# Altium footprint library EXPLORER.PcbLib: 252 footprints (part 6 of 16)
Each footprint in its own frame and in the unit in brackets; x right, y up, seen from the top. Pads: shape width x height; smd on the part's side, far side on the other; paste and mask are expansions set on the pad; w line width, h text height; cw(c..) or ccw(c..) is an arc to the next point about the centre after c.
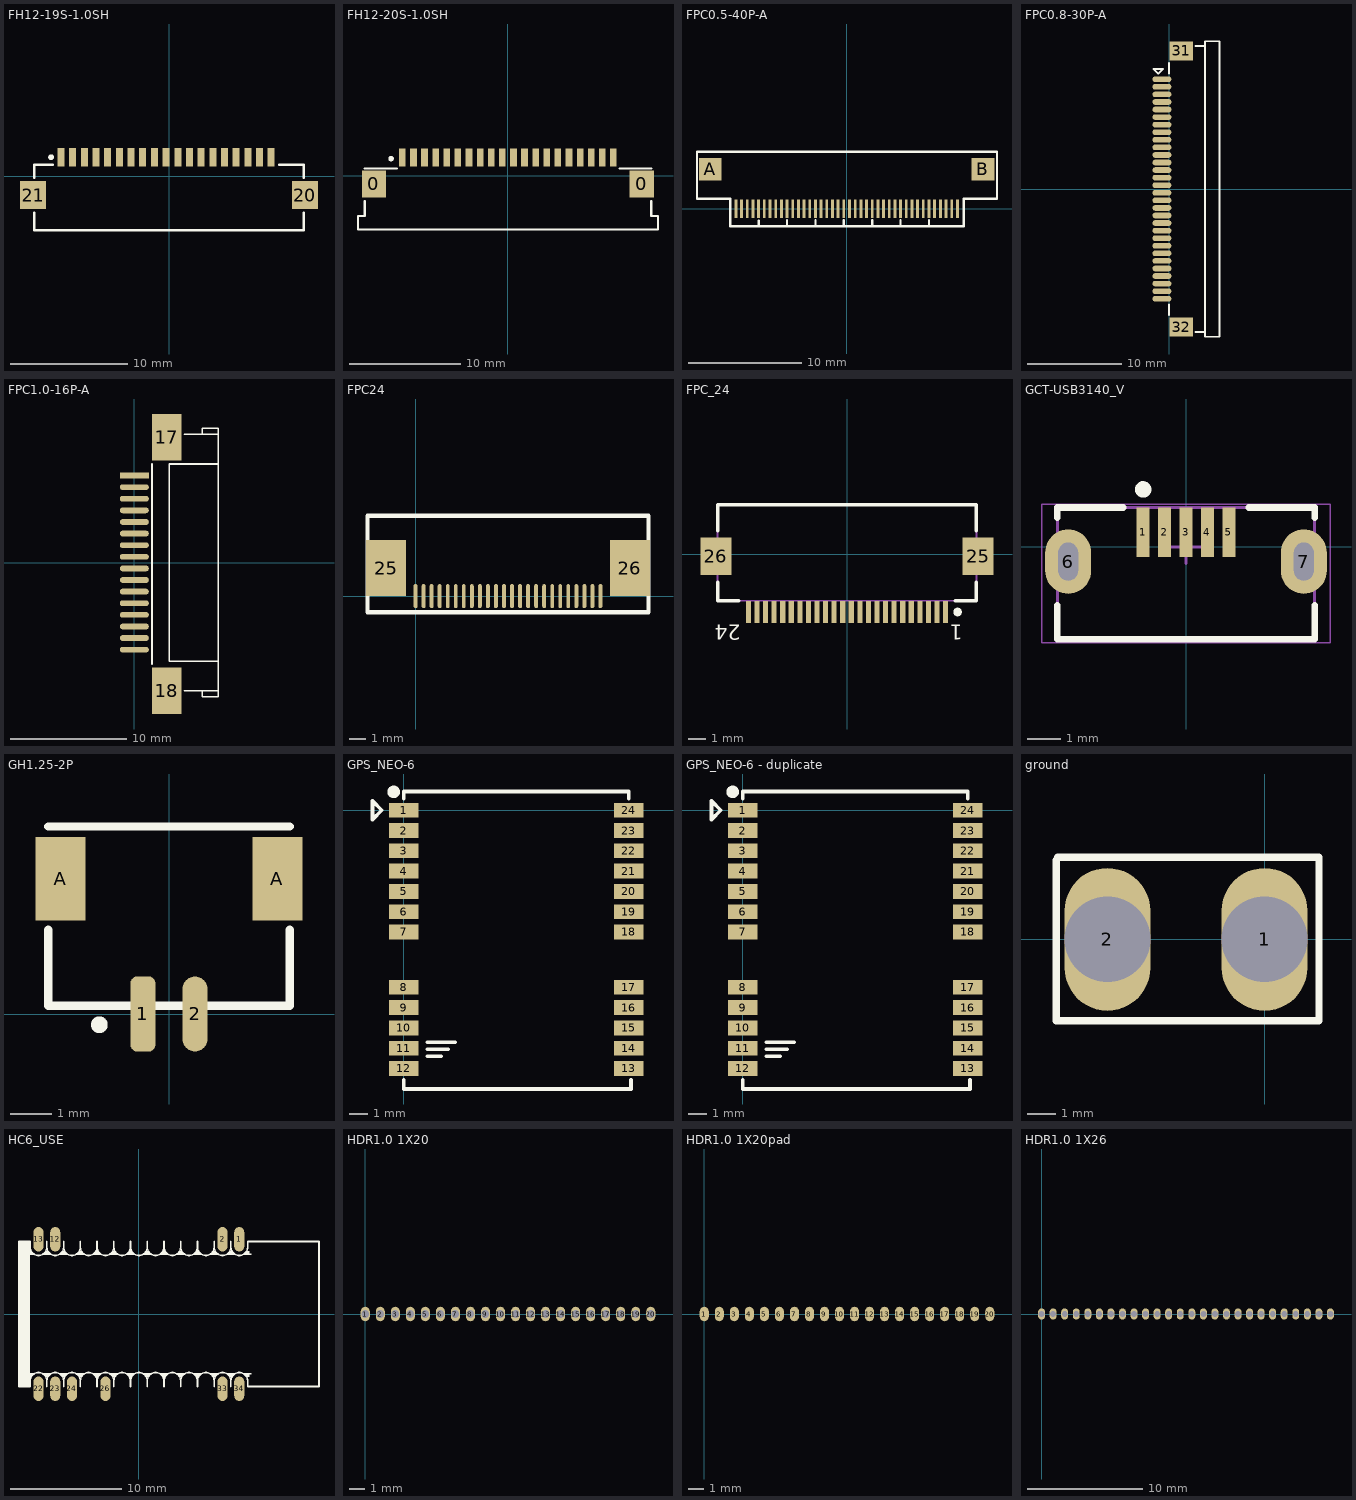
[diagram p5: the footprints below, top view; thin cyan lines are the x and y axes]

## FH12-19S-1.0SH [mm] "Connector; FH12 Series; 19 Position; 1.0mm Spaced Bottom Eccentric Contact"
height 2
pads (21):
  rect 0.6x1.6 smd: 1(-9.25,1.625) 2(-8.25,1.625) 3(-7.25,1.625) 4(-6.25,1.625) 5(-5.25,1.625) 6(-4.25,1.625) 7(-3.25,1.625) 8(-2.25,1.625) 9(-1.25,1.625) 10(-0.25,1.625) 11(0.75,1.625) 12(1.75,1.625) 13(2.75,1.625) 14(3.75,1.625) 15(4.75,1.625) 16(5.75,1.625) 17(6.75,1.625) 18(7.75,1.625) 19(8.75,1.625)
  rect 2.2x2.4 smd: 20(11.65,-1.625) 21(-11.65,-1.625)
Top Overlay:
  circle w0.25: c-10.1,1.625 r0.125
  lines w0.2: -11.55,-3.125 -11.55,-4.625 11.55,-4.625 11.55,-3.125 ; -11.55,-0.125 -11.55,0.975 -9.95,0.975 ; 9.45,0.975 11.55,0.975 11.55,-0.125

## FH12-20S-1.0SH [mm] "Connector; FH12 Series; 20 Position; 1.0mm Spaced Bottom Standard Contact"
height 2
pads (22):
  rect 2.2x2.4 smd: 0(-12.049,-0.762) 0(12.049,-0.762)
  rect 0.6x1.6 smd: 1(-9.5,1.625) 2(-8.5,1.625) 3(-7.5,1.625) 4(-6.5,1.625) 5(-5.5,1.625) 6(-4.5,1.625) 7(-3.5,1.625) 8(-2.5,1.625) 9(-1.5,1.625) 10(-0.5,1.625) 11(0.5,1.625) 12(1.5,1.625) 13(2.5,1.625) 14(3.5,1.625) 15(4.5,1.625) 16(5.5,1.625) 17(6.5,1.625) 18(7.5,1.625) 19(8.5,1.625) 20(9.5,1.625)
Top Overlay:
  circle w0.25: c-10.516,1.524 r0.125
  lines w0.2: -13.489,-4.85 -13.489,-3.651 -12.879,-3.651 -12.879,-2.285 ; -13.487,-4.851 13.513,-4.851 13.513,-3.655 12.903,-3.655 12.903,-2.29 ; -12.903,0.635 -10.003,0.635 ; 10.054,0.635 12.903,0.635
3D body: height 2.8, standoff 0, extent -13.5,-4.865 13.5,1.935

## FPC0.5-40P-A [mm]
height 1
pads (42):
  rect 0.25x1.6 smd: 1(-9.78,0.011) 2(-9.28,0.011) 3(-8.78,0.011) 4(-8.28,0.011) 5(-7.78,0.011) 6(-7.28,0.011) 7(-6.78,0.011) 8(-6.28,0.011) 9(-5.78,0.011) 10(-5.28,0.011) 11(-4.78,0.011) 12(-4.28,0.011) 13(-3.78,0.011) 14(-3.28,0.011) 15(-2.78,0.011) 16(-2.28,0.011) 17(-1.78,0.011) 18(-1.28,0.011) 19(-0.78,0.011) 20(-0.28,0.011) 21(0.22,0.011) 22(0.72,0.011) 23(1.22,0.011) 24(1.72,0.011) 25(2.22,0.011) 26(2.72,0.011) 27(3.22,0.011) 28(3.72,0.011) 29(4.22,0.011) 30(4.72,0.011) 31(5.22,0.011) 32(5.72,0.011) 33(6.22,0.011) 34(6.72,0.011) 35(7.22,0.011) 36(7.72,0.011) 37(8.22,0.011) 38(8.72,0.011) 39(9.22,0.011) 40(9.72,0.011)
  rect 2x2 smd: A(-12.029,3.5) B(11.971,3.5)
Top Overlay:
  lines w0.2: -10.287,-1.524 -10.287,0.889 -13.208,0.889 -13.208,5.036 13.208,5.036 13.208,1.27 13.208,0.889 10.287,0.889 10.287,-1.514 -10.287,-1.514 ; -7.78,-1.514 -7.78,-1.014 ; -5.28,-1.514 -5.28,-0.989 ; -2.78,-1.489 -2.78,-0.989 ; -0.28,-1.464 -0.28,-0.964 ; 2.22,-1.464 2.22,-0.964 ; 4.72,-1.464 4.72,-0.964 ; 7.22,-1.464 7.22,-0.964

## FPC0.8-30P-A [mm] "FPC"
height 1.2
pads (32):
  oval 2x0.6 smd: 1(-0.762,11.6) 2(-0.762,10.8) 3(-0.762,10) 4(-0.762,9.2) 5(-0.762,8.4) 6(-0.762,7.6) 7(-0.762,6.8) 8(-0.762,6) 9(-0.762,5.2) 10(-0.762,4.4) 11(-0.762,3.6) 12(-0.762,2.8) 13(-0.762,2) 14(-0.762,1.2) 15(-0.762,0.4) 16(-0.762,-0.4) 17(-0.762,-1.2) 18(-0.762,-2) 19(-0.762,-2.8) 20(-0.762,-3.6) 21(-0.762,-4.4) 22(-0.762,-5.2) 23(-0.762,-6) 24(-0.762,-6.8) 25(-0.762,-7.6) 26(-0.762,-8.4) 27(-0.762,-9.2) 28(-0.762,-10) 29(-0.762,-10.8) 30(-0.762,-11.6)
  rect 2.5x2 smd: 31(1.27,14.605) 32(1.27,-14.605)
Top Overlay:
  lines w0.2: 0,-13.335 0,-12.192 ; 0,12.192 0,13.335 ; 2.794,-15.113 3.81,-15.113 ; 2.794,15.113 3.81,15.113 ; 3.81,-15.113 3.81,15.113 ; 3.81,-15.113 3.81,-15.621 5.334,-15.621 5.334,15.621 3.81,15.621 3.81,15.113 ; -1.651,12.7 -1.143,12.192 -0.635,12.7 -1.524,12.7 -1.651,12.7

## FPC1.0-16P-A [mm] "FPC"
height 1.2
pads (18):
  rect 2.5x0.5 smd: 1(0,7.493)
  oval 2.5x0.5 smd: 2(0,6.493) 3(0,5.493) 4(0,4.493) 5(0,3.493) 6(0,2.493) 7(0,1.493) 8(0,0.493) 9(0,-0.507) 10(0,-1.507) 11(0,-2.507) 12(0,-3.507) 13(0,-4.507) 14(0,-5.507) 15(0,-6.507) 16(0,-7.507)
  rect 2.5x4 smd: 17(2.794,10.795) 18(2.794,-11.049)
Top Overlay:
  lines w0.15: 1.524,-8.763 1.524,8.509 ; 4.318,-11.049 7.224,-11.049 ; 4.318,11.049 7.224,11.049 ; 5.842,11.049 5.842,11.557 7.224,11.557 7.224,11.049 ; 6.096,-11.049 5.842,-11.049 5.842,-11.557 7.224,-11.557 7.224,-11.049 ; 7.224,-8.507 3,-8.507 3,8.493 7.224,8.493 ; 7.224,-11.049 7.224,11.049

## FPC24 [mm]
pads (26):
  oval 0.241x1.5 smd: 1(0,0) 2(0.5,0) 3(1,0) 4(1.5,0) 5(2,0) 6(2.5,0) 7(3,0) 8(3.5,0) 9(4,0) 10(4.5,0) 11(5,0) 12(5.5,0) 13(6,0) 14(6.5,0) 15(7,0) 16(7.5,0) 17(8,0) 18(8.5,0) 19(9,0) 20(9.5,0) 21(10,0) 22(10.5,0) 23(11,0) 24(11.5,0)
  rect 2.5x3.5 smd: 25(-1.829,1.75) 26(13.329,1.75)
Top Overlay:
  lines w0.254: -3,-1 -3,5 14.5,5 14.5,-1 -3,-1

## FPC_24 [mm]
pads (26):
  rect 0.3x1.3 smd: 1(5.739,-3.359) 2(5.239,-3.359) 3(4.739,-3.359) 4(4.239,-3.359) 5(3.739,-3.359) 6(3.239,-3.359) 7(2.739,-3.359) 8(2.239,-3.359) 9(1.739,-3.359) 10(1.239,-3.359) 11(0.739,-3.359) 12(0.239,-3.359) 13(-0.261,-3.359) 14(-0.761,-3.359) 15(-1.261,-3.359) 16(-1.761,-3.359) 17(-2.261,-3.359) 18(-2.761,-3.359) 19(-3.261,-3.359) 20(-3.761,-3.359) 21(-4.261,-3.359) 22(-4.761,-3.359) 23(-5.261,-3.359) 24(-5.761,-3.359)
  rect 1.8x2.2 smd: 25(7.639,-0.109) 26(-7.661,-0.109)
Top Overlay:
  circle w0.25: c6.439,-3.359 r0.125
  lines w0.2: -7.561,-1.609 -7.561,-2.709 -6.311,-2.709 ; -7.561,1.391 -7.561,2.891 7.539,2.891 7.539,1.391 ; 6.289,-2.709 7.539,-2.709 7.539,-1.609
  text "24" at -6.223,-3.81 h1.5
  text "1" at 6.731,-3.81 h1.5
Mechanical 13:
  lines w0.1: -7.561,-2.709 -7.561,2.891 7.539,2.891 7.539,-2.709 -7.561,-2.709
3D body: height 2, standoff 0, extent -7.561,-2.709 7.539,2.891

## GCT-USB3140_V [mm] "USB, Micro B, Body 7.8x4mm, Pitch 0.65mm"
height 6.5
pads (7):
  rect 0.4x1.5 smd: 1(-1.3,0.445) 2(-0.65,0.445) 3(0,0.445) 4(0.65,0.445) 5(1.3,0.445)
  oval 1.4x1.95 hole 0.6 slot 1.15 at 90 deg: 6(-3.575,-0.445) 7(3.575,-0.445)
Top Overlay:
  circle w0.25: c-1.3,1.745 r0.125
  lines w0.2: -3.9,-1.771 -3.9,-2.805 3.9,-2.805 3.9,-1.771 ; -3.9,0.881 -3.9,1.195 -1.9,1.195 ; 1.9,1.195 3.9,1.195 3.9,0.881
Mechanical 13:
  lines w0.1: -3.9,-2.805 -3.9,1.195 3.9,1.195 3.9,-2.805 -3.9,-2.805
Mechanical 15:
  lines w0.05: -4.375,-2.905 4.375,-2.905 4.375,1.295 -4.375,1.295 -4.375,-2.905
  lines w0.1: -0.5,0 0.5,0 ; 0,-0.5 0,0.5
3D body: height 6.55, standoff -2.25, extent -3.9,-2.805 3.902,1.195

## GH1.25-2P [mm]
pads (4):
  rrect50% 0.6x1.8 smd: 1(-0.625,0)
  oval 0.6x1.8 smd: 2(0.625,0)
  rect 1.2x2 smd: A(-2.6,3.246) A(2.6,3.246)
Top Overlay:
  circle w0.254: c-1.671,-0.258 r0.074
  lines w0.2: -2.9,2.019 -2.9,0.2 2.9,0.2 2.9,2.019 ; -2.9,4.5 2.9,4.5

## GPS_NEO-6 [mm]
height 1.75
pads (24):
  rect 1.6x0.8 smd: 1(0,0) 2(0,-1.1) 3(0,-2.2) 4(0,-3.3) 5(0,-4.4) 6(0,-5.5) 7(0,-6.6) 8(0,-9.6) 9(0,-10.7) 10(0,-11.8) 11(0,-12.9) 12(0,-14) 13(12.2,-14) 14(12.2,-12.9) 15(12.2,-11.8) 16(12.2,-10.7) 17(12.2,-9.6) 18(12.2,-6.6) 19(12.2,-5.5) 20(12.2,-4.4) 21(12.2,-3.3) 22(12.2,-2.2) 23(12.2,-1.1) 24(12.2,0)
Top Overlay:
  circle w0.381: c-0.552,1 r0.152
  lines w0.152: -1.7,-0.5 -1.7,0.5 -1.2,0 -1.7,-0.5
  lines w0.203: 0,-14.605 0,-15.113 12.319,-15.113 12.319,-14.605 ; 0,0.635 0,1.016 12.192,1.016 12.192,0.635 ; 1.27,-13.335 2.032,-13.335 ; 1.27,-12.954 2.413,-12.954 ; 1.27,-12.573 2.794,-12.573 ; -1.2,0 -1.7,-0.5 -1.7,0.5 -1.2,0 ; -1.2,0 -1.2,0

## GPS_NEO-6 - duplicate [mm]
height 1.75
pads (24):
  rect 1.6x0.8 smd: 1(0,0) 2(0,-1.1) 3(0,-2.2) 4(0,-3.3) 5(0,-4.4) 6(0,-5.5) 7(0,-6.6) 8(0,-9.6) 9(0,-10.7) 10(0,-11.8) 11(0,-12.9) 12(0,-14) 13(12.2,-14) 14(12.2,-12.9) 15(12.2,-11.8) 16(12.2,-10.7) 17(12.2,-9.6) 18(12.2,-6.6) 19(12.2,-5.5) 20(12.2,-4.4) 21(12.2,-3.3) 22(12.2,-2.2) 23(12.2,-1.1) 24(12.2,0)
Top Overlay:
  circle w0.381: c-0.552,1 r0.152
  lines w0.152: -1.7,-0.5 -1.7,0.5 -1.2,0 -1.7,-0.5
  lines w0.203: 0,-14.605 0,-15.113 12.319,-15.113 12.319,-14.605 ; 0,0.635 0,1.016 12.192,1.016 12.192,0.635 ; 1.27,-13.335 2.032,-13.335 ; 1.27,-12.954 2.413,-12.954 ; 1.27,-12.573 2.794,-12.573 ; -1.2,0 -1.7,-0.5 -1.7,0.5 -1.2,0 ; -1.2,0 -1.2,0

## ground [mm]
height 8.5
pads (2):
  oval 3x5 hole 3: 1(0,0) 2(-5.5,0)
Top Overlay:
  lines w0.254: -7.29,-2.845 1.88,-2.845 ; -7.29,-2.769 -7.29,2.769 ; -7.239,2.87 1.905,2.87 1.905,-2.845

## HC6_USE [mm]
pads (10):
  oval 0.9x2.2 smd: 1(9,6.7) 2(7.5,6.7) 12(-7.5,6.7) 13(-9,6.7) 22(-9,-6.7) 23(-7.5,-6.7) 24(-6,-6.7) 26(-3,-6.7) 33(7.5,-6.7) 34(9,-6.7)
Top Overlay:
  rectangle: -9.75,-5.675 -9.6,-5.475
  rectangle: -9.75,-5.475 -9.425,-5.3
  rectangle: -9.75,5.475 -9.6,5.675
  rectangle: -9.75,5.3 -9.425,5.475
  rectangle: -10.75,-6.5 -9.75,6.5
  rectangle: 9.59,-5.66 9.91,-5.4
  rectangle: 9.4,-5.425 10.1,-5.275
  rectangle: 8.09,-5.66 8.41,-5.4
  rectangle: 7.9,-5.425 8.6,-5.275
  rectangle: 6.59,-5.66 6.91,-5.4
  rectangle: 6.4,-5.425 7.1,-5.275
  rectangle: 5.09,-5.66 5.41,-5.4
  rectangle: 4.9,-5.425 5.6,-5.275
  rectangle: 3.59,-5.66 3.91,-5.4
  rectangle: 3.4,-5.425 4.1,-5.275
  rectangle: 2.09,-5.66 2.41,-5.4
  rectangle: 1.9,-5.425 2.6,-5.275
  rectangle: 0.59,-5.66 0.91,-5.4
  rectangle: 0.4,-5.425 1.1,-5.275
  rectangle: -0.91,-5.66 -0.59,-5.4
  rectangle: -1.1,-5.425 -0.4,-5.275
  rectangle: -2.41,-5.66 -2.09,-5.4
  rectangle: -2.6,-5.425 -1.9,-5.275
  rectangle: -3.91,-5.66 -3.59,-5.4
  rectangle: -4.1,-5.425 -3.4,-5.275
  rectangle: -5.41,-5.66 -5.09,-5.4
  rectangle: -5.6,-5.425 -4.9,-5.275
  rectangle: -6.91,-5.66 -6.59,-5.4
  rectangle: -7.1,-5.425 -6.4,-5.275
  rectangle: -8.41,-5.66 -8.09,-5.4
  rectangle: -8.6,-5.425 -7.9,-5.275
  rectangle: 9.59,5.4 9.91,5.66
  rectangle: 9.4,5.275 10.1,5.425
  rectangle: 8.09,5.4 8.41,5.66
  rectangle: 7.9,5.275 8.6,5.425
  rectangle: 6.59,5.4 6.91,5.66
  rectangle: 6.4,5.275 7.1,5.425
  rectangle: 5.09,5.4 5.41,5.66
  rectangle: 4.9,5.275 5.6,5.425
  rectangle: 3.59,5.4 3.91,5.66
  rectangle: 3.4,5.275 4.1,5.425
  rectangle: 2.09,5.4 2.41,5.66
  rectangle: 1.9,5.275 2.6,5.425
  rectangle: 0.59,5.4 0.91,5.66
  rectangle: 0.4,5.275 1.1,5.425
  rectangle: -0.91,5.4 -0.59,5.66
  rectangle: -1.1,5.275 -0.4,5.425
  rectangle: -2.41,5.4 -2.09,5.66
  rectangle: -2.6,5.275 -1.9,5.425
  rectangle: -3.91,5.4 -3.59,5.66
  rectangle: -4.1,5.275 -3.4,5.425
  rectangle: -5.41,5.4 -5.09,5.66
  rectangle: -5.6,5.275 -4.9,5.425
  rectangle: -6.91,5.4 -6.59,5.66
  rectangle: -7.1,5.275 -6.4,5.425
  rectangle: -8.41,5.4 -8.09,5.66
  rectangle: -8.6,5.275 -7.9,5.425
  lines w0.152: -8.25,-5.85 -8.25,-6.5 -8.25,-6 ; 9.75,-6 ccw(c9,-6) 8.25,-6 ccw(c7.5,-6) 6.75,-6 ccw(c6,-6) 5.25,-6 ccw(c4.5,-6) 3.75,-6 ccw(c3,-6) 2.25,-6 ccw(c1.5,-6) 0.75,-6 ccw(c0,-6) -0.75,-6 ccw(c-1.5,-6) -2.25,-6 ccw(c-3,-6) -3.75,-6 ccw(c-4.5,-6) -5.25,-6 ccw(c-6,-6) -6.75,-6 ccw(c-7.5,-6) -8.25,-6 ; 9.75,-5.85 9.75,-6.5 16.15,-6.5 16.15,6.5 9.75,6.5 9.75,6 cw(c9,6) 8.25,6 ; -8.25,-6 ccw(c-9,-6) -9.75,-6 -9.75,-6.5 -10.75,-6.5 -10.75,6.5 -9.75,6.5 -9.75,6 ccw(c-9,6) -8.25,6 ; -8.25,6 ccw(c-7.5,6) -6.75,6 ; -8.25,6 -8.25,6.5 -8.25,6 ; -6.75,6 ccw(c-6,6) -5.25,6 ; -6.75,6 -6.75,6.5 -6.75,6 ; -5.25,6 ccw(c-4.5,6) -3.75,6 ; -5.25,6 -5.25,6.5 -5.25,6 ; -3.75,6 ccw(c-3,6) -2.25,6 ; -3.75,6 -3.75,6.5 -3.75,6 ; -2.25,6 ccw(c-1.5,6) -0.75,6 ; -2.25,6 -2.25,6.5 -2.25,6 ; -0.75,6 ccw(c0,6) 0.75,6 ; -0.75,6 -0.75,6.5 -0.75,6 ; 0.75,6 ccw(c1.5,6) 2.25,6 ; 0.75,6 0.75,6.5 0.75,6 ; 2.25,6 ccw(c3,6) 3.75,6 ; 2.25,6 2.25,6.5 2.25,6 ; 3.75,6 ccw(c4.5,6) 5.25,6 ; 3.75,6 3.75,6.5 3.75,6 ; 5.25,6 ccw(c6,6) 6.75,6 ; 5.25,6 5.25,6.5 5.25,6 ; 6.75,6 ccw(c7.5,6) 8.25,6 ; 6.75,6 6.75,6.5 6.75,6 ; 8.25,6 8.25,6.5 8.25,6 ; -6.75,-6.5 -6.75,-5.85 -6.75,-6.5 ; -5.25,-6.5 -5.25,-5.85 -5.25,-6.5 ; -3.75,-6.5 -3.75,-5.85 -3.75,-6.5 ; -2.25,-6.5 -2.25,-5.85 -2.25,-6.5 ; -0.75,-6.5 -0.75,-5.85 -0.75,-6.5 ; 0.75,-6.5 0.75,-5.85 0.75,-6.5 ; 2.25,-6.5 2.25,-5.85 2.25,-6.5 ; 3.75,-6.5 3.75,-5.85 3.75,-6.5 ; 5.25,-6.5 5.25,-5.85 5.25,-6.5 ; 6.75,-6.5 6.75,-5.85 6.75,-6.5 ; 8.25,-6.5 8.25,-5.85 8.25,-6.5

## HDR1.0 1X20 [mm]
pads (20):
  oval 0.6x0.965 hole 0.5: 1(0,0) 2(1,0) 3(2,0) 4(3,0) 5(4,0) 6(5,0) 7(6,0) 8(7,0) 9(8,0) 10(9,0) 11(10,0) 12(11,0) 13(12,0) 14(13,0) 15(14,0) 16(15,0) 17(16,0) 18(17,0) 19(18,0) 20(19,0)

## HDR1.0 1X20pad [mm]
pads (20):
  oval 0.6x0.965 smd: 1(0,0) 2(1,0) 3(2,0) 4(3,0) 5(4,0) 6(5,0) 7(6,0) 8(7,0) 9(8,0) 10(9,0) 11(10,0) 12(11,0) 13(12,0) 14(13,0) 15(14,0) 16(15,0) 17(16,0) 18(17,0) 19(18,0) 20(19,0)

## HDR1.0 1X26 [mm]
pads (26):
  oval 0.6x0.965 hole 0.5: 1(0,0) 2(1,0) 3(2,0) 4(3,0) 5(4,0) 6(5,0) 7(6,0) 8(7,0) 9(8,0) 10(9,0) 11(10,0) 12(11,0) 13(12,0) 14(13,0) 15(14,0) 16(15,0) 17(16,0) 18(17,0) 19(18,0) 20(19,0) 21(19.994,0) 22(20.994,0) 23(21.994,0) 24(22.994,0) 25(23.994,0) 26(24.994,0)